# Altium footprint library Flight_controller v1.0.PcbLib: 98 footprints (part 4 of 7)
Each footprint in its own frame and in the unit in brackets; x right, y up, seen from the top. Pads: shape width x height; smd on the part's side, far side on the other; paste and mask are expansions set on the pad; w line width, h text height; cw(c..) or ccw(c..) is an arc to the next point about the centre after c.
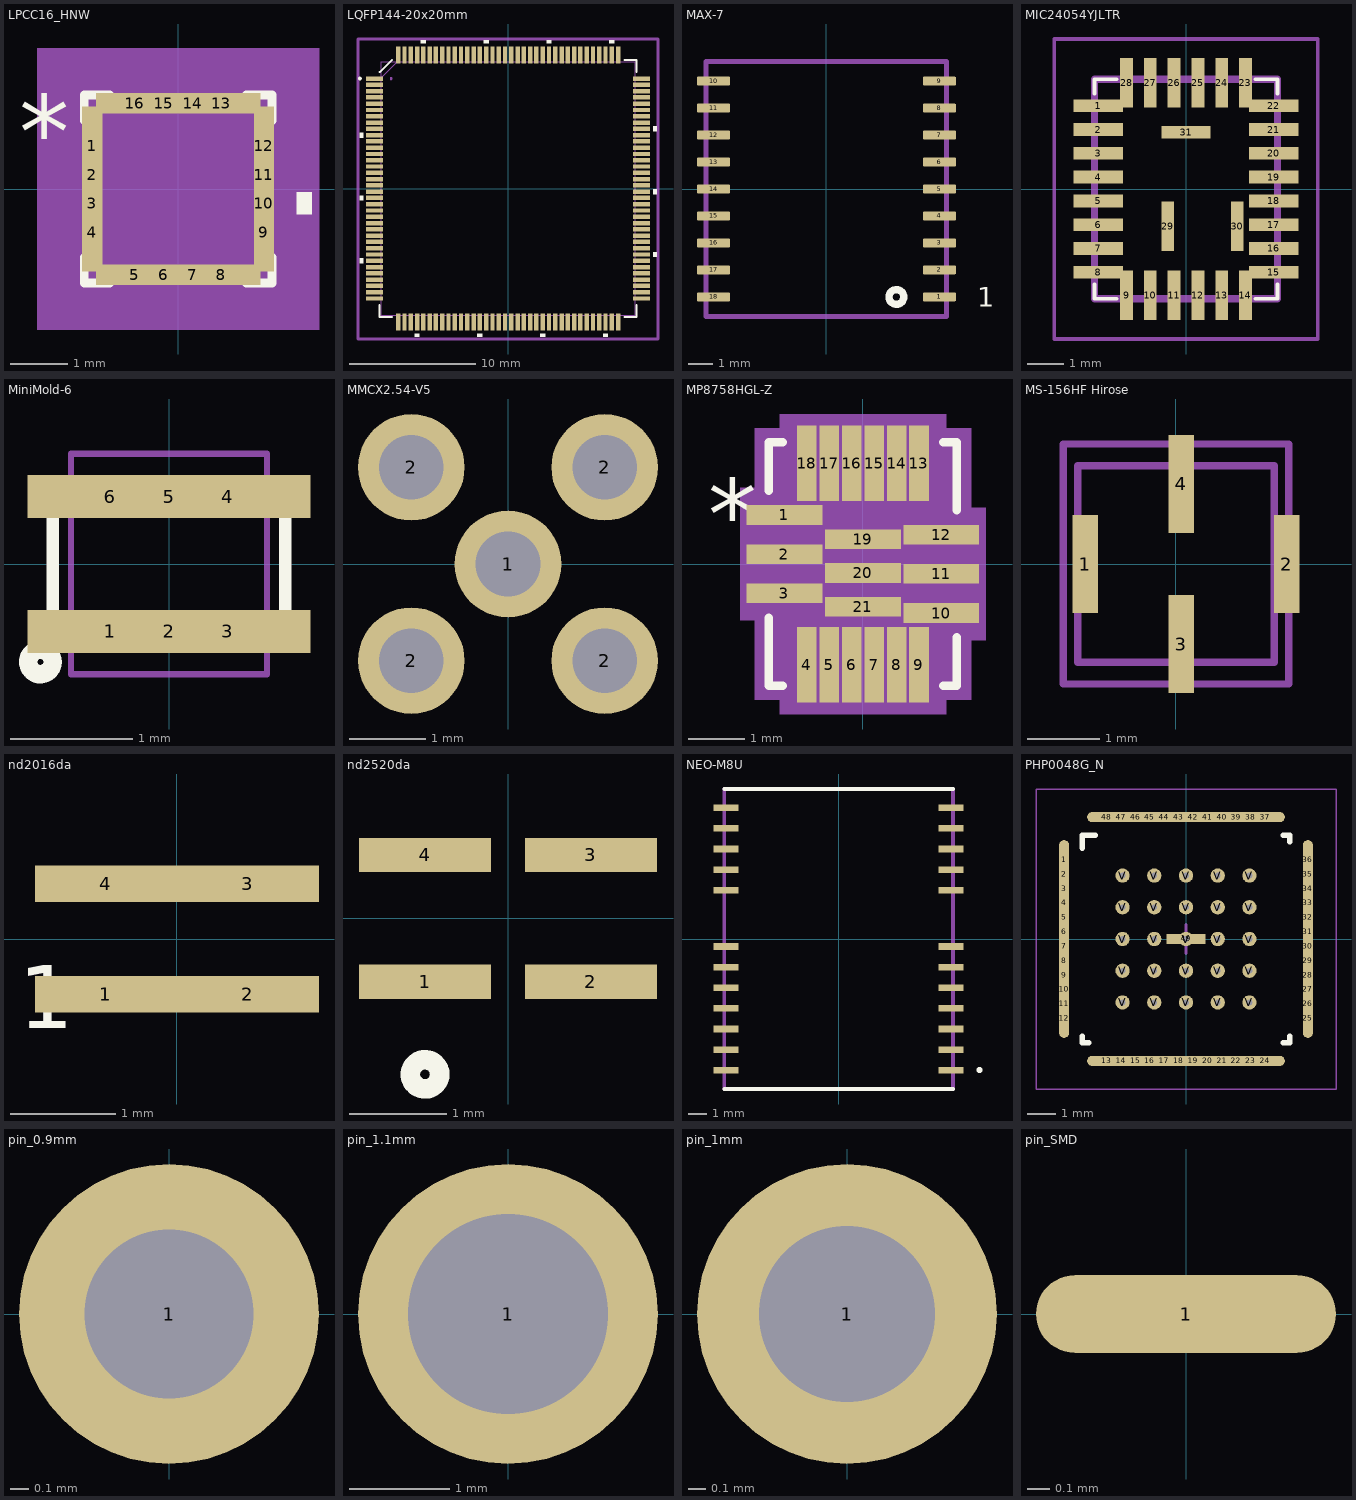
[diagram p3: the footprints below, top view; thin cyan lines are the x and y axes]

## LPCC16_HNW [mm]
pads (16):
  rect 0.35x1.35 smd paste+0.05 mask+0.05: 1(-1.486,0.75) 2(-1.486,0.25) 3(-1.486,-0.25) 4(-1.486,-0.75) 9(1.486,-0.75) 10(1.486,-0.25) 11(1.486,0.25) 12(1.486,0.75)
  rect 1.35x0.35 smd paste+0.05 mask+0.05: 5(-0.75,-1.486) 6(-0.25,-1.486) 7(0.25,-1.486) 8(0.75,-1.486) 13(0.75,1.486) 14(0.25,1.486) 15(-0.25,1.486) 16(-0.75,1.486)
Top Overlay:
  region: 2.057,-0.059 2.311,-0.059 2.311,-0.44 2.057,-0.44
  lines w0.152: -1.626,-1.184 -1.626,-1.626 -1.184,-1.626 ; -1.626,1.184 -1.626,1.626 -1.184,1.626 ; 1.184,-1.626 1.626,-1.626 1.626,-1.184 ; 1.184,1.626 1.626,1.626 1.626,1.184
  text "*" at -2.756,0.365 h1.27
Mechanical 5:
  region: 2.438,-2.438 -2.438,-2.438 -2.438,2.438 2.438,2.438
Mechanical 13:
  lines w0.025: -1.499,0.229 -0.229,1.499 ; -1.499,-1.499 -1.499,1.499 1.499,1.499 1.499,-1.499 -1.499,-1.499 ; -1.499,-0.877 -1.499,-0.623 -1.499,-0.877 ; -1.499,-0.377 -1.499,-0.123 -1.499,-0.377 ; -1.499,0.123 -1.499,0.377 -1.499,0.123 ; -1.499,0.623 -1.499,0.877 -1.499,0.623 ; -0.877,-1.499 -0.623,-1.499 -0.877,-1.499 ; -0.877,1.499 -0.623,1.499 -0.877,1.499 ; -0.377,-1.499 -0.123,-1.499 -0.377,-1.499 ; -0.377,1.499 -0.123,1.499 -0.377,1.499 ; 0.123,-1.499 0.377,-1.499 0.123,-1.499 ; 0.123,1.499 0.377,1.499 0.123,1.499 ; 0.623,-1.499 0.877,-1.499 0.623,-1.499 ; 0.623,1.499 0.877,1.499 0.623,1.499 ; 1.499,-0.877 1.499,-0.623 1.499,-0.877 ; 1.499,-0.377 1.499,-0.123 1.499,-0.377 ; 1.499,0.123 1.499,0.377 1.499,0.123 ; 1.499,0.623 1.499,0.877 1.499,0.623
  text "*" at -1.486,0.365 h1.27
Mechanical 15:
  region: -1.106,-1.753 -1.753,-1.753 -1.753,-1.106 -2.057,-1.106 -2.057,1.106 -1.753,1.106 -1.753,1.753 -1.106,1.753 -1.106,2.057 1.106,2.057 1.106,1.753 1.753,1.753 1.753,1.106 2.057,1.106 2.057,-1.106 1.753,-1.106 1.753,-1.753 1.106,-1.753 1.106,-2.057 -1.106,-2.057
  lines w0.152: -2.057,-1.106 -2.057,1.106 -1.753,1.106 -1.753,1.753 -1.106,1.753 -1.106,2.057 1.106,2.057 1.106,1.753 1.753,1.753 1.753,1.106 2.057,1.106 2.057,-1.106 1.753,-1.106 1.753,-1.753 1.106,-1.753 1.106,-2.057 -1.106,-2.057 -1.106,-1.753 -1.753,-1.753 -1.753,-1.106 -2.057,-1.106
3D body "LPCC16_HNW.step": height 0.89, standoff 0, extent -1.499,-1.499 1.499,1.499

## LQFP144-20x20mm [mm]
pads (144):
  rect 1.35x0.35 smd paste+0.05 mask+0.05: 1(-10.625,8.75) 2(-10.625,8.25) 3(-10.625,7.75) 4(-10.625,7.25) 5(-10.625,6.75) 6(-10.625,6.25) 7(-10.625,5.75) 8(-10.625,5.25) 9(-10.625,4.75) 10(-10.625,4.25) 11(-10.625,3.75) 12(-10.625,3.25) 13(-10.625,2.75) 14(-10.625,2.25) 15(-10.625,1.75) 16(-10.625,1.25) 17(-10.625,0.75) 18(-10.625,0.25) 19(-10.625,-0.25) 20(-10.625,-0.75) 21(-10.625,-1.25) 22(-10.625,-1.75) 23(-10.625,-2.25) 24(-10.625,-2.75) 25(-10.625,-3.25) 26(-10.625,-3.75) 27(-10.625,-4.25) 28(-10.625,-4.75) 29(-10.625,-5.25) 30(-10.625,-5.75) 31(-10.625,-6.25) 32(-10.625,-6.75) 33(-10.625,-7.25) 34(-10.625,-7.75) 35(-10.625,-8.25) 36(-10.625,-8.75) 73(10.625,-8.75) 74(10.625,-8.25) 75(10.625,-7.75) 76(10.625,-7.25) 77(10.625,-6.75) 78(10.625,-6.25) 79(10.625,-5.75) 80(10.625,-5.25) 81(10.625,-4.75) 82(10.625,-4.25) 83(10.625,-3.75) 84(10.625,-3.25) 85(10.625,-2.75) 86(10.625,-2.25) 87(10.625,-1.75) 88(10.625,-1.25) 89(10.625,-0.75) 90(10.625,-0.25) 91(10.625,0.25) 92(10.625,0.75) 93(10.625,1.25) 94(10.625,1.75) 95(10.625,2.25) 96(10.625,2.75) 97(10.625,3.25) 98(10.625,3.75) 99(10.625,4.25) 100(10.625,4.75) 101(10.625,5.25) 102(10.625,5.75) 103(10.625,6.25) 104(10.625,6.75) 105(10.625,7.25) 106(10.625,7.75) 107(10.625,8.25) 108(10.625,8.75)
  rect 0.35x1.35 smd paste+0.05 mask+0.05: 37(-8.75,-10.625) 38(-8.25,-10.625) 39(-7.75,-10.625) 40(-7.25,-10.625) 41(-6.75,-10.625) 42(-6.25,-10.625) 43(-5.75,-10.625) 44(-5.25,-10.625) 45(-4.75,-10.625) 46(-4.25,-10.625) 47(-3.75,-10.625) 48(-3.25,-10.625) 49(-2.75,-10.625) 50(-2.25,-10.625) 51(-1.75,-10.625) 52(-1.25,-10.625) 53(-0.75,-10.625) 54(-0.25,-10.625) 55(0.25,-10.625) 56(0.75,-10.625) 57(1.25,-10.625) 58(1.75,-10.625) 59(2.25,-10.625) 60(2.75,-10.625) 61(3.25,-10.625) 62(3.75,-10.625) 63(4.25,-10.625) 64(4.75,-10.625) 65(5.25,-10.625) 66(5.75,-10.625) 67(6.25,-10.625) 68(6.75,-10.625) 69(7.25,-10.625) 70(7.75,-10.625) 71(8.25,-10.625) 72(8.75,-10.625) 109(8.75,10.625) 110(8.25,10.625) 111(7.75,10.625) 112(7.25,10.625) 113(6.75,10.625) 114(6.25,10.625) 115(5.75,10.625) 116(5.25,10.625) 117(4.75,10.625) 118(4.25,10.625) 119(3.75,10.625) 120(3.25,10.625) 121(2.75,10.625) 122(2.25,10.625) 123(1.75,10.625) 124(1.25,10.625) 125(0.75,10.625) 126(0.25,10.625) 127(-0.25,10.625) 128(-0.75,10.625) 129(-1.25,10.625) 130(-1.75,10.625) 131(-2.25,10.625) 132(-2.75,10.625) 133(-3.25,10.625) 134(-3.75,10.625) 135(-4.25,10.625) 136(-4.75,10.625) 137(-5.25,10.625) 138(-5.75,10.625) 139(-6.25,10.625) 140(-6.75,10.625) 141(-7.25,10.625) 142(-7.75,10.625) 143(-8.25,10.625) 144(-8.75,10.625)
Top Overlay:
  circle w0.152: c-11.802,8.75 r0.076
  region: 11.552,4.941 11.806,4.941 11.806,4.56 11.552,4.56
  region: 11.552,-0.059 11.806,-0.059 11.806,-0.44 11.552,-0.44
  region: 11.552,-5.059 11.806,-5.059 11.806,-5.44 11.552,-5.44
  region: 8.441,11.552 8.06,11.552 8.06,11.806 8.441,11.806
  region: 7.94,-11.552 7.559,-11.552 7.559,-11.806 7.94,-11.806
  region: 3.441,11.552 3.06,11.552 3.06,11.806 3.441,11.806
  region: 2.94,-11.552 2.559,-11.552 2.559,-11.806 2.94,-11.806
  region: -1.559,11.552 -1.94,11.552 -1.94,11.806 -1.559,11.806
  region: -2.06,-11.552 -2.441,-11.552 -2.441,-11.806 -2.06,-11.806
  region: -6.559,11.552 -6.94,11.552 -6.94,11.806 -6.559,11.806
  region: -7.06,-11.552 -7.441,-11.552 -7.441,-11.806 -7.06,-11.806
  region: -11.552,-0.56 -11.806,-0.56 -11.806,-0.941 -11.552,-0.941
  region: -11.552,-5.56 -11.806,-5.56 -11.806,-5.941 -11.552,-5.941
  region: -11.552,4.44 -11.806,4.44 -11.806,4.059 -11.552,4.059
  lines w0.152: -10.223,-9.261 -10.223,-10.223 -9.261,-10.223 ; -10.223,9.261 -9.261,10.223 ; 9.261,-10.223 10.223,-10.223 10.223,-9.261 ; 9.261,10.223 10.223,10.223 10.223,9.261
Mechanical 5:
  lines w0.254: -11.951,-11.976 11.925,-11.976 11.925,11.9 -11.951,11.9 -11.951,-11.976
Mechanical 13:
  circle w0: c-9.317,8.75 r0.076
  lines w0.025: -10.096,8.826 -8.826,10.096 ; -10.096,-10.096 -10.096,10.096 10.096,10.096 10.096,-10.096 -10.096,-10.096
  text ".Designator" at -4.572,1.286 h1
3D body "LQFP144-20x20mm.step": height 1.6, standoff 0, extent -10.948,-10.948 10.948,10.948

## MAX-7 [mm] "MAX-7; GPS U-Blox footprint"
height 4
pads (18):
  rrect20% 1.35x0.35 smd paste+0.05 mask+0.05: 1(4.6,-4.4) 2(4.6,-3.3) 3(4.6,-2.2) 4(4.6,-1.1) 5(4.6,0) 6(4.6,1.1) 7(4.6,2.2) 8(4.6,3.3) 9(4.6,4.4) 10(-4.6,4.4) 11(-4.6,3.3) 12(-4.6,2.2) 13(-4.6,1.1) 14(-4.6,0) 15(-4.6,-1.1) 16(-4.6,-2.2) 17(-4.6,-3.3) 18(-4.6,-4.4)
Top Overlay:
  circle w0.3: c2.85,-4.4 r0.3
  text "1" at 6.15,-4.8 h0.8
Mechanical 15:
  lines w0.2: -4.9,-5.2 -4.9,5.2 4.9,5.2 4.9,-5.2 -4.9,-5.2
3D body: height 2.95, standoff 0, extent -4.9,-5.2 4.9,5.2

## MIC24054YJLTR [mm]
pads (31):
  rect 1.35x0.35 smd paste+0.05 mask+0.05: 1(-2.4,2.275) 2(-2.4,1.625) 3(-2.4,0.975) 4(-2.4,0.325) 5(-2.4,-0.325) 6(-2.4,-0.975) 7(-2.4,-1.625) 8(-2.4,-2.275) 15(2.4,-2.275) 16(2.4,-1.625) 17(2.4,-0.975) 18(2.4,-0.325) 19(2.4,0.325) 20(2.4,0.975) 21(2.4,1.625) 22(2.4,2.275) 31(0,1.55)
  rect 0.35x1.35 smd paste+0.05 mask+0.05: 9(-1.625,-2.9) 10(-0.975,-2.9) 11(-0.325,-2.9) 12(0.325,-2.9) 13(0.975,-2.9) 14(1.625,-2.9) 23(1.625,2.9) 24(0.975,2.9) 25(0.325,2.9) 26(-0.325,2.9) 27(-0.975,2.9) 28(-1.625,2.9) 29(-0.5,-1.015) 30(1.4,-1.015)
Top Overlay:
  lines w0.1: -2.5,-2.6 -2.5,-3 -1.9,-3 ; -2.5,2.6 -2.5,3 -1.9,3 ; 1.9,-3 2.5,-3 2.5,-2.6 ; 1.9,3 2.5,3 2.5,2.6
Mechanical 13:
  lines w0.2: -2.5,-3 2.5,-3 2.5,3 -2.5,3 -2.5,-3
Mechanical 15:
  lines w0.1: -3.6,-4.1 3.6,-4.1 3.6,4.1 -3.6,4.1 -3.6,-4.1
3D body "MIC26903YJL-TR.stp": height 2.1, standoff 0, extent -2.5,-3 2.5,3

## MiniMold-6 [mm] "MiniMold-6 Package 1.5x1.1mm"
height 0.55
pads (6):
  rect 1.35x0.35 smd paste+0.05 mask+0.05: 1(-0.48,-0.55) 2(0,-0.55) 3(0.48,-0.55) 4(0.48,0.55) 5(0,0.55) 6(-0.48,0.55)
Top Overlay:
  circle w0.15: c-1.05,-0.8 r0.1
  lines w0.1: -0.95,-0.55 -0.95,0.55 ; 0.95,-0.55 0.95,0.55
Mechanical 15:
  lines w0.05: -0.8,-0.9 0.8,-0.9 0.8,0.9 -0.8,0.9 -0.8,-0.9
3D body: height 1, standoff 0, extent -0.75,-0.55 0.75,0.55

## MMCX2.54-V5 [mm] "Connector; RF Coaxial, MMCX, Thru-Hole; 5 Position; Vertical"
height 4.45
pads (5):
  round 1.4 hole 0.85: 1(0,0) 2(-1.27,-1.27) 2(-1.27,1.27) 2(1.27,-1.27) 2(1.27,1.27)

## MP8758HGL-Z [mm]
pads (21):
  rect 1.35x0.35 smd paste+0.05 mask+0.05: 1(-1.4,0.875) 2(-1.4,0.175) 3(-1.4,-0.525) 10(1.4,-0.875) 11(1.4,-0.175) 12(1.4,0.525) 19(0,0.44) 20(0,-0.16) 21(0,-0.76)
  rect 0.35x1.35 smd paste+0.05 mask+0.05: 4(-1,-1.8) 5(-0.6,-1.8) 6(-0.2,-1.8) 7(0.2,-1.8) 8(0.6,-1.8) 9(1,-1.8) 13(1,1.8) 14(0.6,1.8) 15(0.2,1.8) 16(-0.2,1.8) 17(-0.6,1.8) 18(-1,1.8)
Top Layer:
  region: -1.094,0.977 -1.806,0.977 -1.806,0.773 -0.994,0.773 -0.994,0.877
Top Overlay:
  lines w0.152: -1.676,-0.959 -1.676,-2.172 -1.434,-2.172 ; -1.676,1.309 -1.676,2.172 -1.434,2.172 ; 1.434,-2.172 1.676,-2.172 1.676,-1.309 ; 1.434,2.172 1.676,2.172 1.676,0.959
  text "*" at -2.756,0.254 h1.27
Top Paste:
  region: -1.094,0.977 -1.806,0.977 -1.806,0.773 -0.994,0.773 -0.994,0.877
Top Solder:
  region: -1.094,0.977 -1.806,0.977 -1.806,0.773 -0.994,0.773 -0.994,0.877
Mechanical 5:
  region: 1.483,2.426 1.483,2.676 -1.483,2.676 -1.483,2.426 -1.93,2.426 -1.93,1.358 -2.187,1.358 -2.187,-1.008 -1.93,-1.008 -1.93,-2.426 -1.483,-2.426 -1.483,-2.676 1.483,-2.676 1.483,-2.426 1.93,-2.426 1.93,-1.358 2.187,-1.358 2.187,1.008 1.93,1.008 1.93,2.426
Mechanical 13:
  lines w0.025: -1.549,0.775 -0.279,2.045 ; -1.549,-2.045 1.549,-2.045 1.549,2.045 -1.549,2.045 -1.549,-2.045
  text "*" at -2.451,0.254 h1.27
Mechanical 15:
  region: -2.06,1.231 -2.06,-0.881 -1.803,-0.881 -1.803,-2.299 -1.356,-2.299 -1.356,-2.549 1.356,-2.549 1.356,-2.299 1.803,-2.299 1.803,-1.231 2.06,-1.231 2.06,0.881 1.803,0.881 1.803,2.299 1.356,2.299 1.356,2.549 -1.356,2.549 -1.356,2.299 -1.803,2.299 -1.803,1.231
  lines w0.152: -2.06,-0.881 -2.06,1.231 -1.803,1.231 -1.803,2.299 -1.356,2.299 -1.356,2.549 1.356,2.549 1.356,2.299 1.803,2.299 1.803,0.881 2.06,0.881 2.06,-1.231 1.803,-1.231 1.803,-2.299 1.356,-2.299 1.356,-2.549 -1.356,-2.549 -1.356,-2.299 -1.803,-2.299 -1.803,-0.881 -2.06,-0.881
3D body: height 0.25, standoff 0, extent 0,0 0.254,0.254
3D body "MP8758GL.step": height 0.9, standoff 0, extent -1.516,-2 1.484,2

## MS-156HF Hirose [mm] "Hirose MS-156HF receptacle - MS-156HF"
height 1.6
pads (4):
  rect 0.35x1.35 smd paste+0.05 mask+0.05: 1(-1.25,0) 2(1.525,0) 3(0.075,-1.1) 4(0.075,1.1)
Mechanical 13:
  lines w0.1: -1.55,-1.65 -1.55,1.65 1.55,1.65 1.55,-1.65 -1.55,-1.65
Mechanical 15:
  lines w0.1: -1.35,-1.35 -1.35,1.35 1.35,1.35 1.35,-1.35 -1.35,-1.35
3D body: height 16, standoff 1.3, extent -1.35,-1.35 1.35,1.35

## nd2016da [mm] "Crystal SMD 2.0x1.6mm"
height 0.55
pads (4):
  rect 1.35x0.35 smd paste+0.05 mask+0.05: 1(-0.675,-0.525) 2(0.675,-0.525) 3(0.675,0.525) 4(-0.675,0.525)
Top Overlay:
  text "1" at -1.5,-0.85 h0.6
3D body: height 1, standoff 0, extent -1,-0.8 1,0.8

## nd2520da [mm] "Crystal SMD 2.5x2.0mm"
height 0.7
pads (4):
  rect 1.35x0.35 smd paste+0.05 mask+0.05: 1(-0.85,-0.65) 2(0.85,-0.65) 3(0.85,0.65) 4(-0.85,0.65)
Top Overlay:
  circle w0.2: c-0.85,-1.6 r0.15
3D body: height 1, standoff 0, extent -1.25,-1 1.25,1

## NEO-M8U [mm]
pads (24):
  rect 1.35x0.35 smd paste+0.05 mask+0.05: 1(6,-7) 2(6,-5.9) 3(6,-4.8) 4(6,-3.7) 5(6,-2.6) 6(6,-1.5) 7(6,-0.4) 8(6,2.6) 9(6,3.7) 10(6,4.8) 11(6,5.9) 12(6,7) 13(-6,7) 14(-6,5.9) 15(-6,4.8) 16(-6,3.7) 17(-6,2.6) 18(-6,-0.4) 19(-6,-1.5) 20(-6,-2.6) 21(-6,-3.7) 22(-6,-4.8) 23(-6,-5.9) 24(-6,-7)
Top Overlay:
  circle w0.2: c7.514,-6.988 r0.062
  lines w0.2: -6.1,-8 6.1,-8 ; -6.1,8 6.1,8
Mechanical 13:
  lines w0.2: -6.1,-8 -6.1,8 6.1,8 6.1,-8 -6.1,-8
3D body "NEO-M8P-0.STEP": height 2.61, standoff 0.01, extent -6.227,-8 5.973,8

## PHP0048G_N [mm]
pads (74):
  oval 0.35x1.35 smd paste+0.05 mask+0.05: 1(-4.225,2.75) 2(-4.225,2.25) 3(-4.225,1.75) 4(-4.225,1.25) 5(-4.225,0.75) 6(-4.225,0.25) 7(-4.225,-0.25) 8(-4.225,-0.75) 9(-4.225,-1.25) 10(-4.225,-1.75) 11(-4.225,-2.25) 12(-4.225,-2.75) 25(4.225,-2.75) 26(4.225,-2.25) 27(4.225,-1.75) 28(4.225,-1.25) 29(4.225,-0.75) 30(4.225,-0.25) 31(4.225,0.25) 32(4.225,0.75) 33(4.225,1.25) 34(4.225,1.75) 35(4.225,2.25) 36(4.225,2.75)
  oval 1.35x0.35 smd paste+0.05 mask+0.05: 13(-2.75,-4.225) 14(-2.25,-4.225) 15(-1.75,-4.225) 16(-1.25,-4.225) 17(-0.75,-4.225) 18(-0.25,-4.225) 19(0.25,-4.225) 20(0.75,-4.225) 21(1.25,-4.225) 22(1.75,-4.225) 23(2.25,-4.225) 24(2.75,-4.225) 37(2.75,4.225) 38(2.25,4.225) 39(1.75,4.225) 40(1.25,4.225) 41(0.75,4.225) 42(0.25,4.225) 43(-0.25,4.225) 44(-0.75,4.225) 45(-1.25,4.225) 46(-1.75,4.225) 47(-2.25,4.225) 48(-2.75,4.225)
  rect 1.35x0.35 smd paste+0.05 mask+0.05: 49(0,0)
  round 0.5 hole 0.203 mask+0.051: V(-2.2,-2.2) V(-2.2,-1.1) V(-2.2,0) V(-2.2,1.1) V(-2.2,2.2) V(-1.1,-2.2) V(-1.1,-1.1) V(-1.1,0) V(-1.1,1.1) V(-1.1,2.2) V(0,-2.2) V(0,-1.1) V(0,0) V(0,1.1) V(0,2.2) V(1.1,-2.2) V(1.1,-1.1) V(1.1,0) V(1.1,1.1) V(1.1,2.2) V(2.2,-2.2) V(2.2,-1.1) V(2.2,0) V(2.2,1.1) V(2.2,2.2)
Top Overlay:
  lines w0.2: -3.6,-3.375 -3.6,-3.6 -3.375,-3.6 ; -3.6,3.15 -3.6,3.6 -3.15,3.6 ; 3.375,-3.6 3.6,-3.6 3.6,-3.375 ; 3.375,3.6 3.6,3.6 3.6,3.375
Mechanical 13:
  text ".Designator" at -1.854,-1.143 h1.27
Mechanical 15:
  lines w0.05: -5.2,-5.2 -5.2,5.2 5.2,5.2 5.2,-5.2 -5.2,-5.2
  lines w0.1: -0.5,0 0.5,0 ; 0,-0.5 0,0.5
3D body: height 0.25, standoff 0, extent 0,0 0.254,0.254
3D body "PHP0048G.stp": height 1.1, standoff 0, extent -4.515,-4.515 4.515,4.515

## pin_0.9mm [mm] "Generic Pin 0.9mm; 1 Lead"
height 1
pads (1):
  round 1.6 hole 0.9 mask+0.05: 1(0,0)

## pin_1.1mm [mm] "Generic Pin 1.1mm; 1 Lead"
height 1
pads (1):
  round 3 hole 2 mask+0.05: 1(0,0)

## pin_1mm [mm] "Generic Pin 1.1mm; 1 Lead"
height 1
pads (1):
  round 1.7 hole 1 paste+0 mask+0.05: 1(0,0)

## pin_SMD [mm] "Generic Pin; 1 pin SMD"
height 0.5
pads (1):
  oval 1.35x0.35 smd paste+0.05 mask+0.05: 1(0,0)